# Altium footprint library SMD Component.PcbLib: 163 footprints (part 1 of 11)
Each footprint in its own frame and in the unit in brackets; x right, y up, seen from the top. Pads: shape width x height; smd on the part's side, far side on the other; paste and mask are expansions set on the pad; w line width, h text height; cw(c..) or ccw(c..) is an arc to the next point about the centre after c.
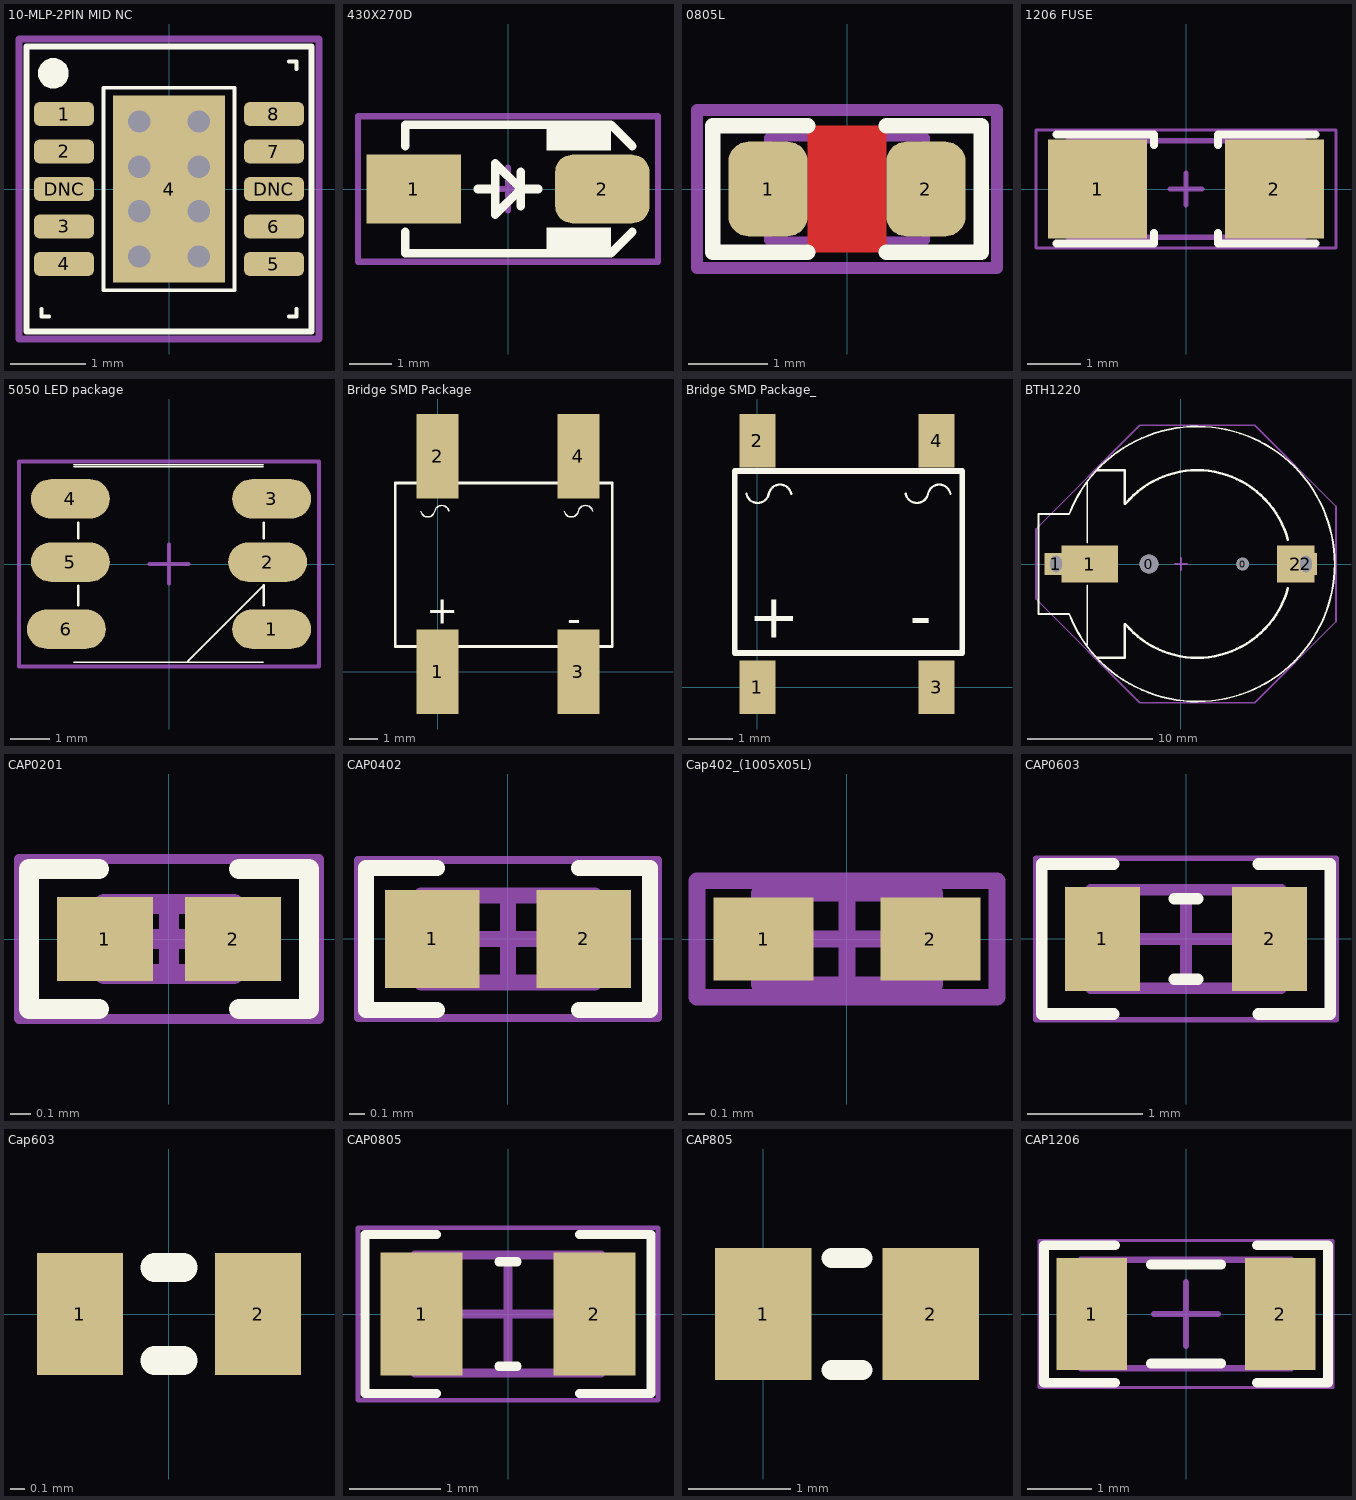
[diagram p0: the footprints below, top view; thin cyan lines are the x and y axes]

## 10-MLP-2PIN MID NC [mm] "MO-229, 10-Leads, Body 3x3mm"
height 1
pads (11):
  rrect50% 0.8x0.32 smd mask+0.05: 1(-1.4,1) 2(-1.4,0.5) 3(-1.4,-0.5) 4(-1.4,-1) 5(1.4,-1) 6(1.4,-0.5) 7(1.4,0.5) 8(1.4,1) DNC(-1.4,0) DNC(1.4,0)
  rect 1.5x2.5 smd mask+0.051: 4(0,0)
via 0.4,0.3 diameter 0.5 hole 0.3
via -0.4,-0.3 diameter 0.5 hole 0.3
via 0.4,-0.3 diameter 0.5 hole 0.3
via 0.4,0.9 diameter 0.5 hole 0.3
via -0.4,0.9 diameter 0.5 hole 0.3
via -0.4,-0.9 diameter 0.5 hole 0.3
via 0.4,-0.9 diameter 0.5 hole 0.3
via -0.4,0.3 diameter 0.5 hole 0.3
Top Overlay:
  region: -1.541,1.341 -1.502,1.341 -1.428,1.372 -1.372,1.428 -1.341,1.502 -1.341,1.541 -1.341,1.581 -1.372,1.655 -1.428,1.711 -1.502,1.741 -1.541,1.741 -1.581,1.741 -1.655,1.711 -1.711,1.655 -1.741,1.581 -1.741,1.541 -1.741,1.502 -1.711,1.428 -1.655,1.372 -1.581,1.341
  lines w0.05: -1.7,-1.6 -1.7,-1.7 -1.6,-1.7 ; 1.6,-1.7 1.7,-1.7 1.7,-1.6 ; 1.6,1.7 1.7,1.7 1.7,1.6 ; -0.875,-1.35 0.875,-1.35 0.875,1.35 -0.875,1.35 -0.875,-1.35
  lines w0.075: -1.9,-1.9 -1.9,1.9 1.9,1.9 1.9,-1.9 -1.9,-1.9
Mechanical 15:
  lines w0.1: -0.5,0 0.5,0 ; 0,-0.5 0,0.5 ; -2,-2 2,-2 2,2 -2,2 -2,-2
3D body: height 1.01, standoff 1, extent -1.3,1 -0.9,1.4
3D body: height 1, standoff 0, extent -1.7,-1.7 1.7,1.7

## 430X270D [mm] "SMA Molded Diode, 2-Leads, Body 4.3x2.7mm"
height 2.4
pads (2):
  rect 2.2x1.6 smd: 1(-2.2,0)
  rrect50% 2.2x1.6 smd: 2(2.2,0)
Top Overlay:
  rectangle: 0.9,0.9 2.4,1.5
  rectangle: 0.9,-1.5 2.4,-0.9
  lines w0.2: -2.4,-1 -2.4,-1.5 2.4,-1.5 2.9,-1 ; -2.4,1 -2.4,1.5 2.4,1.5 2.9,1 ; -0.7,0 -0.3,0 ; 0.3,-0.4 0.3,0.4 ; 0.7,0 0.3,0 ; 0.3,0 -0.3,-0.6 -0.3,0.6 0.3,0
Mechanical 15:
  lines w0.15: -0.5,0 0.5,0 ; 0,-0.5 0,0.5 ; -3.5,-1.7 -3.5,1.7 3.5,1.7 3.5,-1.7 -3.5,-1.7
3D body "User Library-DIOM5528X26.step": height 2.6, standoff 0.03, extent -2.75,-1.4 2.75,1.4

## 0805L [mm] ",0805, 2012, 200X130"
height 7.62
pads (2):
  rrect50% 1x1.2 smd mask+0.075: 1(-1,0) 2(1,0)
Top Layer:
  pour cut-out: -0.5,0.8 0.5,0.8 0.5,-0.8 -0.5,-0.8
Top Overlay:
  lines w0.2: -0.5,-0.8 -1.7,-0.8 -1.7,0.8 -0.5,0.8 ; 0.5,-0.8 1.7,-0.8 1.7,0.8 0.5,0.8
Mechanical 13:
  lines w0.1: -1,-0.65 1,-0.65 1,0.65 -1,0.65 -1,-0.65
Mechanical 15:
  lines w0.15: -0.2,0 0.2,0 ; 0,-0.2 0,0.2 ; -1.9,-1 -1.9,1 1.9,1 1.9,-1 -1.9,-1
3D body "User Library-ind_0805.step": height 0.95, standoff 0, extent -1,-0.6 1,0.6

## 1206 FUSE [mm] "Fast Acting Smd 1206 non-Resettable Fuse Chip For Pcb Board-Design:Abbas Basereh"
height 1
pads (2):
  rect 1.85x1.85 smd: 1(-1.65,0) 2(1.65,0)
Top Overlay:
  lines w0.15: -2.413,-1.016 -0.6,-1.016 -0.6,-0.825 ; -2.413,1.016 -0.6,1.016 -0.6,0.825 ; 0.6,-0.825 0.6,-1.016 2.413,-1.016 ; 0.6,0.825 0.6,1.016 2.413,1.016
Mechanical 13:
  lines w0.1: -2.2,-0.9 2.2,-0.9 2.2,0.9 -2.2,0.9 -2.2,-0.9
Mechanical 15:
  lines w0.05: -2.8,-1.1 2.8,-1.1 2.8,1.1 -2.8,1.1 -2.8,-1.1
  lines w0.1: -0.3,0 0.3,0 ; 0,-0.3 0,0.3
3D body "User Library-FUSER_nanoSMD.STEP": height 1, standoff 0, extent -1.602,-0.8 1.603,0.8

## 5050 LED package [mm] "DESIGNER ABBAS BASEREH"
height 1.6
pads (6):
  oval 2x1 smd: 1(2.6,-1.65) 2(2.5,0.05) 3(2.6,1.65) 4(-2.5,1.65) 5(-2.5,0.05) 6(-2.6,-1.65)
Top Overlay:
  lines w0.04: -2.41,-2.486 1.691,-2.486 2.39,-2.486 ; -2.41,2.464 2.39,2.464 ; -2.41,2.514 2.39,2.514 ; 0.475,-2.461 2.4,-0.536
  lines w0.06: -2.3,-1.05 -2.3,-0.55 ; -2.3,0.65 -2.3,1.05 ; 2.4,-1.05 2.4,-0.536 ; 2.4,0.65 2.4,1.05
Mechanical 15:
  lines w0.1: -0.5,0 0.5,0 ; 0,-0.5 0,0.5 ; -3.8,-2.6 3.8,-2.6 3.8,2.6 -3.8,2.6 -3.8,-2.6
3D body "User Library-APA102C.STEP": height 1.55, standoff 0, extent -2.75,-2.5 2.75,2.5

## Bridge SMD Package [mm] "SMD Bridge Rectifiers DESIGNER :Ali Hafizi"
pads (4):
  rect 1.5x3 smd: 1(0,0) 2(0,7.65) 3(5,0) 4(5,7.65)
Top Overlay:
  lines w0.05: -0.6,5.7 ccw(c-0.35,5.75) -0.1,5.7 cw(c0.15,5.65) 0.4,5.7 ; 4.5,5.7 ccw(c4.75,5.75) 5,5.7 cw(c5.25,5.65) 5.5,5.7
  lines w0.1: -1.5,0.9 -1.5,6.7 6.2,6.7 6.2,0.9 -1.5,0.9
  text "+" at -0.4,1.7 h1
  text "-" at 4.6,1.4 h1
3D body "User Library-PONTE-1.STEP": height 2.7, standoff 0, extent -1.6,-1.2 6.5,8.95

## Bridge SMD Package_ [mm] "SMD Bridge Rectifiers DESIGNER :Ali Hafizi"
pads (4):
  rect 0.8x1.2 smd: 1(0,0) 2(0,5.5) 3(4,0) 4(4,5.5)
Top Overlay:
  lines w0.05: -0.246,4.318 ccw(c0.004,4.368) 0.254,4.318 cw(c0.504,4.268) 0.754,4.318 ; 3.31,4.318 ccw(c3.56,4.368) 3.81,4.318 cw(c4.06,4.268) 4.31,4.318
  lines w0.127: -0.508,0.762 -0.508,4.826 4.572,4.826 4.572,0.762 -0.508,0.762
  text "+" at -0.2,1.1 h1
  text "-" at 3.4,1.1 h1

## BTH1220 [mm] "COIN CELL BATTERY HOLDER 1220 12mm CR1220"
height 2
pads (6):
  round 1.5 hole 1.5 unplated: 0(-2.563,0)
  round 1 hole 1 unplated: 0(4.93,0)
  rect 1.8x1.8 hole 0.9 slot 1.3 at 90 deg: 1(-10,0) 2(10,0)
  rect 4.5x3 smd: 1(-7.3,0)
  rect 3x3 smd: 2(9.2,0)
Top Overlay:
  lines w0.15: -8.962,4 -11.4,4 -11.4,-4 -8.954,-4 ; -8.948,-3.998 ccw(c1.3,0) -8.949,3.995 ; -7.5,-6.5 -7.5,-1.7 ; -7.5,1.7 -7.5,6.6
  lines w0.2: -6.7,-7.5 -4.5,-7.5 -4.5,-4.821 ; -6.7,7.5 -4.5,7.5 -4.5,4.821 ; -4.445,-4.821 ccw(c1.3,0) 8.544,-1.941 ; -4.445,4.821 cw(c1.3,0) 8.544,1.941
Mechanical 15:
  lines w0.15: -0.5,0 0.5,0 ; 0,-0.5 0,0.5 ; -11.6,-2.8 -11.6,2.8 -3.3,11.1 5.9,11.1 12.4,4.6 12.4,-4.6 5.9,-11.1 -3.3,-11.1 -11.6,-2.8
3D body "User Library-Battery Holder for CR1220 SMD.step": height 4.28, standoff -0.47, extent -8.46,-7.389 10.341,7.36

## CAP0201 [mm] "Chip Capacitor, 2-Leads, Body 0/60x0/30mm, IPC Medium Density DESIGNER:ABBAS BASEREH"
height 0.23
pads (2):
  rect 0.48x0.42 smd mask+0.04: 1(-0.32,0) 2(0.32,0)
Top Overlay:
  lines w0.1: -0.35,-0.35 -0.7,-0.35 -0.7,0.35 -0.35,0.35 ; 0.35,-0.35 0.7,-0.35 0.7,0.35 0.35,0.35
Mechanical 13:
  lines w0.1: -0.325,-0.175 0.325,-0.175 0.325,0.175 -0.325,0.175 -0.325,-0.175
Mechanical 15:
  lines w0.05: -0.75,-0.4 0.75,-0.4 0.75,0.4 -0.75,0.4 -0.75,-0.4
  lines w0.1: -0.175,0 0.175,0 ; 0,-0.175 0,0.175
3D body "CAP0201.step": height 0.23, standoff 0, extent -0.325,-0.175 0.325,0.175

## CAP0402 [mm] "Chip Capacitor, 2-Leads, Body 1/00x0/50mm, IPC Medium Density DESIGNER:ABBAS BASEREH"
height 0.32
pads (2):
  rect 0.6x0.62 smd mask+0.06: 1(-0.48,0) 2(0.48,0)
Top Overlay:
  lines w0.1: -0.45,-0.45 -0.9,-0.45 -0.9,0.45 -0.45,0.45 ; 0.45,-0.45 0.9,-0.45 0.9,0.45 0.45,0.45
Mechanical 13:
  lines w0.1: -0.55,-0.275 -0.55,0.275 0.55,0.275 0.55,-0.275 -0.55,-0.275
Mechanical 15:
  lines w0.05: -0.95,-0.5 -0.95,0.5 0.95,0.5 0.95,-0.5 -0.95,-0.5
  lines w0.1: -0.275,0 0.275,0 ; 0,-0.275 0,0.275
3D body "CAP0402.step": height 0.32, standoff 0, extent -0.55,-0.275 0.55,0.275

## Cap402_(1005X05L) [mm] "Chip Capacitor, 2-Leads, Body 1.0x0.5mm, IPC High Density"
height 0.5
pads (2):
  rect 0.6x0.5 smd: 1(-0.5,0) 2(0.5,0)
Mechanical 13:
  lines w0.1: -0.525,-0.275 -0.525,0.275 0.525,0.275 0.525,-0.275 -0.525,-0.275
Mechanical 15:
  lines w0.1: -0.275,0 0.275,0 ; 0,-0.275 0,0.275 ; -0.9,-0.35 -0.9,0.35 0.9,0.35 0.9,-0.35 -0.9,-0.35
3D body "User Library-0402(1005M) Cap.step": height 0.51, standoff 0, extent -0.51,-0.25 0.506,0.258

## CAP0603 [mm] "Chip Capacitor, 2-Leads, Body 1/60x0/80mm, IPC Medium Density DESIGNER:ABBAS BASEREH"
height 0.4
pads (2):
  rect 0.65x0.9 smd: 1(-0.725,0) 2(0.725,0)
Top Overlay:
  lines w0.1: -0.625,-0.65 -1.25,-0.65 -1.25,0.65 -0.625,0.65 ; -0.1,-0.35 0.1,-0.35 ; -0.1,0.35 0.1,0.35 ; 0.625,-0.65 1.25,-0.65 1.25,0.65 0.625,0.65
Mechanical 13:
  lines w0.1: -0.825,-0.425 -0.825,0.425 0.825,0.425 0.825,-0.425 -0.825,-0.425
Mechanical 15:
  lines w0.05: -1.3,-0.7 -1.3,0.7 1.3,0.7 1.3,-0.7 -1.3,-0.7
  lines w0.1: -0.425,0 0.425,0 ; 0,-0.425 0,0.425
3D body "CAP0603.step": height 0.4, standoff 0, extent -0.825,-0.425 0.825,0.425

## Cap603 [mm]
pads (2):
  rect 0.6x0.85 smd: 1(-0.622,0) 2(0.622,0)
Top Overlay:
  lines w0.2: -0.1,-0.325 0.1,-0.325 ; -0.1,0.325 0.1,0.325
3D body "cap 0603.STEP": height 0.6, standoff 0, extent -0.762,-0.381 0.762,0.381

## CAP0805 [mm] "Chip Capacitor, 2-Leads, Body 2/00x1/25mm, IPC Medium Density DESIGNER:ABBAS BASEREH"
height 0.5
pads (2):
  rect 0.9x1.35 smd: 1(-0.95,0) 2(0.95,0)
Top Overlay:
  lines w0.1: -0.788,-0.875 -1.575,-0.875 -1.575,0.875 -0.788,0.875 ; -0.1,-0.575 0.1,-0.575 ; -0.1,0.575 0.1,0.575 ; 0.788,-0.875 1.575,-0.875 1.575,0.875 0.788,0.875
Mechanical 13:
  lines w0.1: -1.025,-0.65 -1.025,0.65 1.025,0.65 1.025,-0.65 -1.025,-0.65
Mechanical 15:
  lines w0.05: -1.65,-0.95 -1.65,0.95 1.65,0.95 1.65,-0.95 -1.65,-0.95
  lines w0.1: -0.5,0 0.5,0 ; 0,-0.5 0,0.5
3D body "CAP0805.step": height 0.5, standoff 0, extent -1.025,-0.65 1.025,0.65

## CAP805 [mm]
pads (2):
  rect 0.95x1.3 smd: 1(0,0) 2(1.65,0)
Top Overlay:
  lines w0.2: 0.675,-0.55 0.975,-0.55 ; 0.675,0.55 0.975,0.55
3D body "cap 0805.STEP": height 0.65, standoff 0, extent -0.191,-0.635 1.841,0.635

## CAP1206 [mm] "Chip Capacitor, 2-Leads, Body 3/20x1/60mm, IPC Medium Density DESIGNER:ABBAS BASEREH"
height 0.94
pads (2):
  rect 1.1x1.75 smd: 1(-1.475,0) 2(1.475,0)
Top Overlay:
  lines w0.15: -1.112,-1.075 -2.225,-1.075 -2.225,1.075 -1.112,1.075 ; -0.55,-0.775 0.55,-0.775 ; -0.55,0.775 0.55,0.775 ; 1.112,-1.075 2.225,-1.075 2.225,1.075 1.112,1.075
Mechanical 13:
  lines w0.1: -1.65,-0.85 1.65,-0.85 1.65,0.85 -1.65,0.85 -1.65,-0.85
Mechanical 15:
  lines w0.05: -2.3,-1.15 2.3,-1.15 2.3,1.15 -2.3,1.15 -2.3,-1.15
  lines w0.1: -0.5,0 0.5,0 ; 0,-0.5 0,0.5
3D body "CAP1206.step": height 0.94, standoff 0, extent -1.65,-0.85 1.65,0.85